# Altium footprint library CAP_TH.PcbLib: 220 footprints (part 7 of 14)
Each footprint in its own frame and in the unit in brackets; x right, y up, seen from the top. Pads: shape width x height; smd on the part's side, far side on the other; paste and mask are expansions set on the pad; w line width, h text height; cw(c..) or ccw(c..) is an arc to the next point about the centre after c.
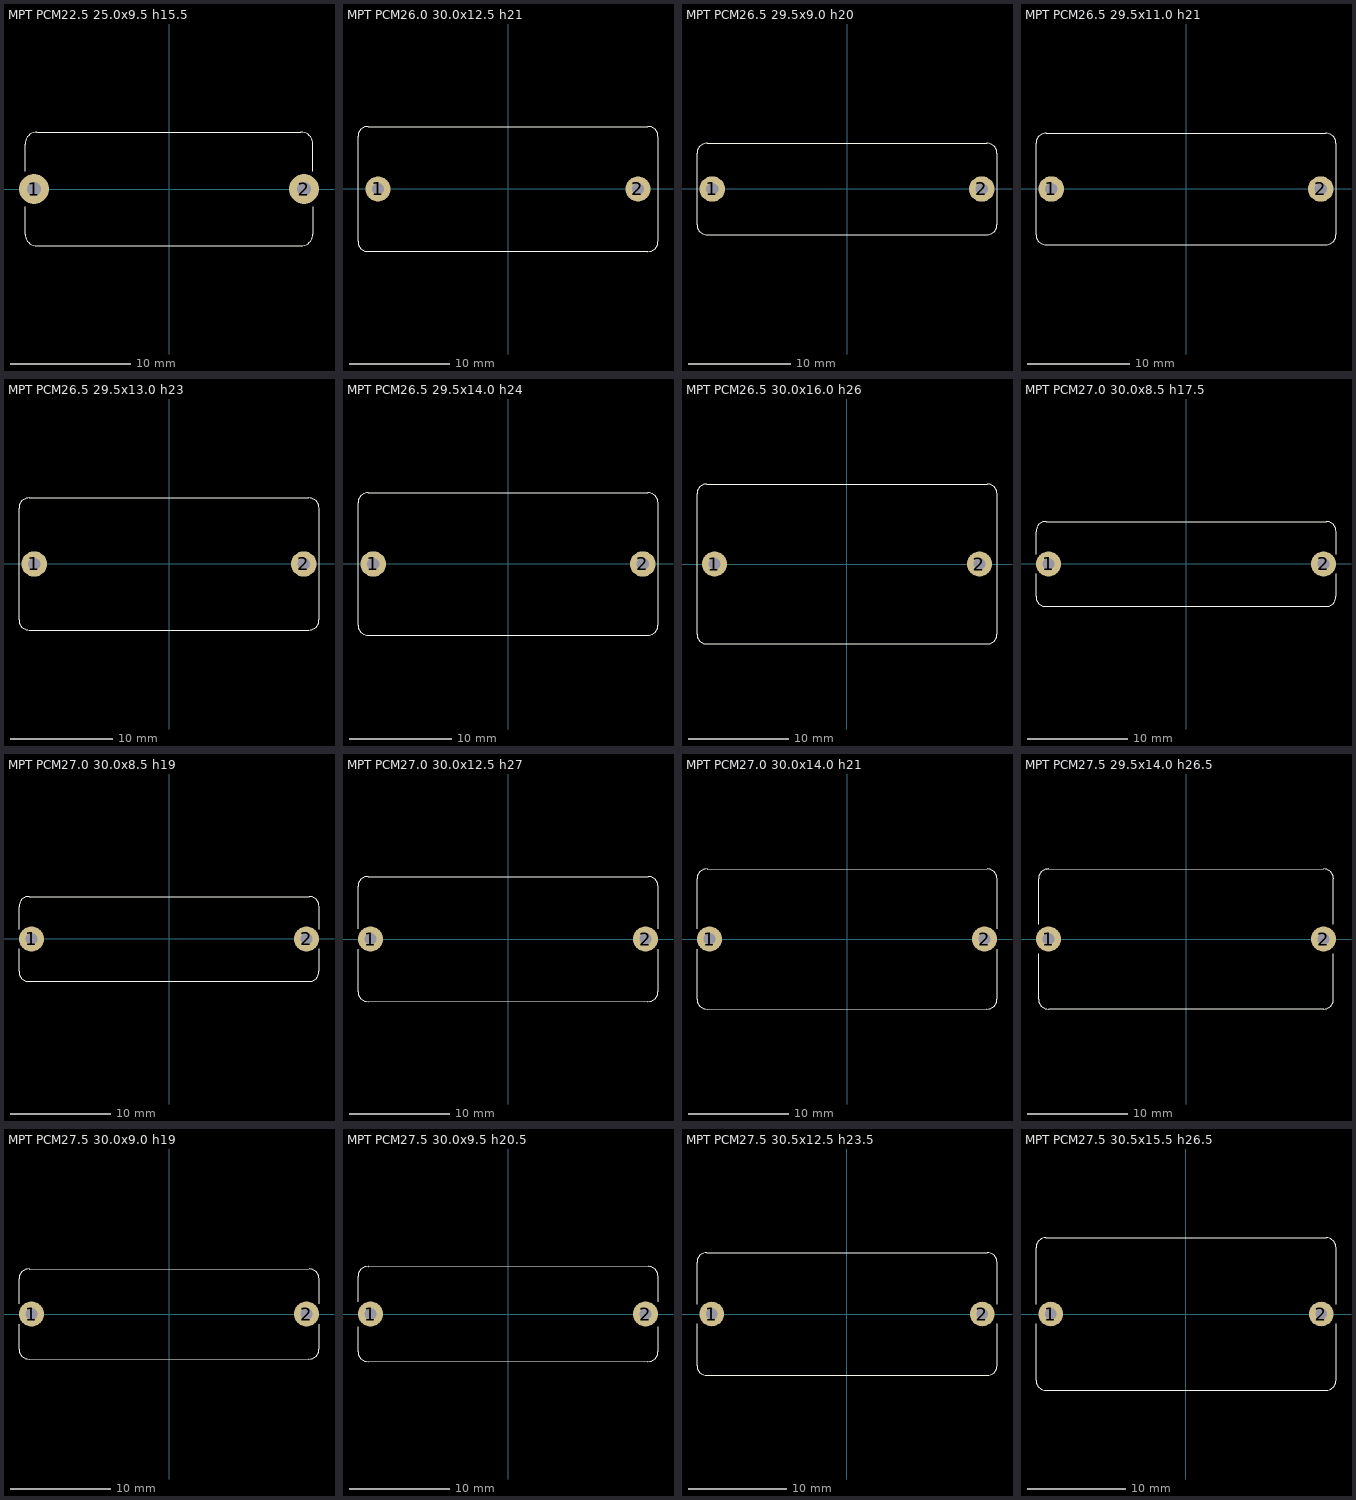
[diagram p6: the footprints below, top view; thin cyan lines are the x and y axes]

## MPT PCM22.5 25.0x9.5 h15.5 [mm]
pads (2):
  round 2.5 hole 1.2: 1(-11.25,0) 2(11.25,0)
Top Overlay:
  lines w0.1: -12,-1.5 -12,-3.75 ccw(c-11,-3.75) -11,-4.75 11,-4.75 ccw(c11,-3.75) 12,-3.75 12,-1.5 ; -12,1.5 -12,3.75 cw(c-11,3.75) -11,4.75 11,4.75 cw(c11,3.75) 12,3.75 12,1.5
3D body "MPT PCM22.5 25.0x9.5 h15.5.STEP": height 17.5, standoff -2, extent -12,-4.75 12,4.75

## MPT PCM26.0 30.0x12.5 h21 [mm]
pads (2):
  round 2.5 hole 1.2: 1(-13,0) 2(13,0)
Top Overlay:
  lines w0.1: -15,-5.25 ccw(c-14,-5.25) -14,-6.25 14,-6.25 ccw(c14,-5.25) 15,-5.25 15,5.25 ccw(c14,5.25) 14,6.25 -14,6.25 ccw(c-14,5.25) -15,5.25 -15,-5.25
3D body "MPT PCM26.0 30.0x12.5 h21.STEP": height 23, standoff -2, extent -15,-6.25 15,6.25

## MPT PCM26.5 29.5x9.0 h20 [mm]
pads (2):
  round 2.5 hole 1.2: 1(-13.25,0) 2(13.25,0)
Top Overlay:
  lines w0.1: -14.75,-3.5 ccw(c-13.75,-3.5) -13.75,-4.5 13.75,-4.5 ccw(c13.75,-3.5) 14.75,-3.5 14.75,3.5 ccw(c13.75,3.5) 13.75,4.5 -13.75,4.5 ccw(c-13.75,3.5) -14.75,3.5 -14.75,-3.5
3D body "MPT PCM26.5 29.5x9.0 h20.STEP": height 22, standoff -2, extent -14.75,-4.5 14.75,4.5

## MPT PCM26.5 29.5x11.0 h21 [mm]
pads (2):
  round 2.5 hole 1.2: 1(-13.25,0) 2(13.25,0)
Top Overlay:
  lines w0.1: -14.75,-4.5 ccw(c-13.75,-4.5) -13.75,-5.5 13.75,-5.5 ccw(c13.75,-4.5) 14.75,-4.5 14.75,4.5 ccw(c13.75,4.5) 13.75,5.5 -13.75,5.5 ccw(c-13.75,4.5) -14.75,4.5 -14.75,-4.5
3D body "MPT PCM26.5 29.5x11.0 h21.STEP": height 23, standoff -2, extent -14.75,-5.5 14.75,5.5

## MPT PCM26.5 29.5x13.0 h23 [mm]
pads (2):
  round 2.5 hole 1.2: 1(-13.25,0) 2(13.25,0)
Top Overlay:
  lines w0.1: -14.75,-5.5 ccw(c-13.75,-5.5) -13.75,-6.5 13.75,-6.5 ccw(c13.75,-5.5) 14.75,-5.5 14.75,5.5 ccw(c13.75,5.5) 13.75,6.5 -13.75,6.5 ccw(c-13.75,5.5) -14.75,5.5 -14.75,-5.5
3D body "MPT PCM26.5 29.5x13.0 h23.STEP": height 25, standoff -2, extent -14.75,-6.5 14.75,6.5

## MPT PCM26.5 29.5x14.0 h24 [mm]
pads (2):
  round 2.5 hole 1.2: 1(-13.25,0) 2(13.25,0)
Top Overlay:
  lines w0.1: -14.75,-6 ccw(c-13.75,-6) -13.75,-7 13.75,-7 ccw(c13.75,-6) 14.75,-6 14.75,6 ccw(c13.75,6) 13.75,7 -13.75,7 ccw(c-13.75,6) -14.75,6 -14.75,-6
3D body "MPT PCM26.5 29.5x14.0 h24.STEP": height 26.5, standoff -2, extent -14.75,-7 14.75,7

## MPT PCM26.5 30.0x16.0 h26 [mm]
pads (2):
  round 2.5 hole 1.2: 1(-13.25,0) 2(13.25,0)
Top Overlay:
  lines w0.1: -15,-7 ccw(c-14,-7) -14,-8 14,-8 ccw(c14,-7) 15,-7 15,7 ccw(c14,7) 14,8 -14,8 ccw(c-14,7) -15,7 -15,-7
3D body "MPT PCM26.5 30.0x16.0 h26.STEP": height 28, standoff -2, extent -15,-8 15,8

## MPT PCM27.0 30.0x8.5 h17.5 [mm]
pads (2):
  round 2.5 hole 1.2: 1(-13.75,0) 2(13.75,0)
Top Overlay:
  lines w0.1: -15.004,-3.25 ccw(c-14.004,-3.25) -14.004,-4.25 13.996,-4.25 ccw(c13.996,-3.25) 14.996,-3.25 ; -15,-3.25 -15,-1 ; -15,1 -15,3.25 cw(c-14,3.25) -14,4.25 14,4.25 cw(c14,3.25) 15,3.25 15,1 ; 15,-3.25 15,-1
3D body "MPT PCM27.0 30.0x8.5 h17.5.STEP": height 19.5, standoff -2, extent -15,-4.25 15,4.25

## MPT PCM27.0 30.0x8.5 h19 [mm]
pads (2):
  round 2.5 hole 1.2: 1(-13.75,0) 2(13.75,0)
Top Overlay:
  lines w0.1: -15.004,-3.25 ccw(c-14.004,-3.25) -14.004,-4.25 13.996,-4.25 ccw(c13.996,-3.25) 14.996,-3.25 ; -15,-3.25 -15,-1 ; -15,1 -15,3.25 cw(c-14,3.25) -14,4.25 14,4.25 cw(c14,3.25) 15,3.25 15,1 ; 15,-3.25 15,-1
3D body "MPT PCM27.0 30.0x8.5 h19.STEP": height 21, standoff -2, extent -15,-4.25 15,4.25

## MPT PCM27.0 30.0x12.5 h27 [mm]
pads (2):
  round 2.5 hole 1.2: 1(-13.75,0) 2(13.75,0)
Top Overlay:
  lines w0.1: -15,-1 -15,-5.25 ccw(c-14,-5.25) -14,-6.25 14,-6.25 ccw(c14,-5.25) 15,-5.25 15,-1 ; -15,1 -15,5.25 cw(c-14,5.25) -14,6.25 14,6.25 cw(c14,5.25) 15,5.25 15,1
3D body "MPT PCM27.0 30.0x12.5 h27.STEP": height 29, standoff -2, extent -15,-6.25 15,6.25

## MPT PCM27.0 30.0x14.0 h21 [mm]
pads (2):
  round 2.5 hole 1.2: 1(-13.75,0) 2(13.75,0)
Top Overlay:
  lines w0.1: -15,-1 -15,-6 ccw(c-14,-6) -14,-7 14,-7 ccw(c14,-6) 15,-6 15,-1 ; -15,1 -15,6 cw(c-14,6) -14,7 14,7 cw(c14,6) 15,6 15,1
3D body "MPT PCM27.0 30.0x14.0 h21.STEP": height 23, standoff -2, extent -15,-7 15,7

## MPT PCM27.5 29.5x14.0 h26.5 [mm]
pads (2):
  round 2.5 hole 1.2: 1(-13.75,0) 2(13.75,0)
Top Overlay:
  lines w0.1: -14.75,-1.5 -14.75,-6 ccw(c-13.75,-6) -13.75,-7 13.75,-7 ccw(c13.75,-6) 14.75,-6 14.75,-1.5 ; -14.75,1.5 -14.75,6 cw(c-13.75,6) -13.75,7 ; -14,7 13.75,7 cw(c13.75,6) 14.75,6 14.75,1.5
3D body "MPT PCM27.5 29.5x14.0 h26.5.STEP": height 28.5, standoff -2, extent -14.75,-7 14.75,7

## MPT PCM27.5 30.0x9.0 h19 [mm]
pads (2):
  round 2.5 hole 1.2: 1(-13.75,0) 2(13.75,0)
Top Overlay:
  lines w0.1: -15,-1 -15,-3.5 ccw(c-14,-3.5) -14,-4.5 14,-4.5 ccw(c14,-3.5) 15,-3.5 15,-1 ; -15,1 -15,3.5 cw(c-14,3.5) -14,4.5 14,4.5 cw(c14,3.5) 15,3.5 15,1
3D body "MPT PCM27.5 30.0x9.0 h19.STEP": height 21, standoff -2, extent -15,-4.5 15,4.5

## MPT PCM27.5 30.0x9.5 h20.5 [mm]
pads (2):
  round 2.5 hole 1.2: 1(-13.75,0) 2(13.75,0)
Top Overlay:
  lines w0.1: -15,-1.25 -15,-3.75 ccw(c-14,-3.75) -14,-4.75 14,-4.75 ccw(c14,-3.75) 15,-3.75 15,-1.25 ; -15,1.25 -15,3.75 cw(c-14,3.75) -14,4.75 14,4.75 cw(c14,3.75) 15,3.75 15,1.25
3D body "MPT PCM27.5 30.0x9.5 h20.5.STEP": height 22.5, standoff -2, extent -15,-4.75 15,4.75

## MPT PCM27.5 30.5x12.5 h23.5 [mm]
pads (2):
  round 2.5 hole 1.2: 1(-13.75,0) 2(13.75,0)
Top Overlay:
  lines w0.1: -15.25,-1 -15.25,-5.25 ccw(c-14.25,-5.25) -14.25,-6.25 14.25,-6.25 ccw(c14.25,-5.25) 15.25,-5.25 15.25,-1 ; -15.25,1 -15.25,5.25 cw(c-14.25,5.25) -14.25,6.25 14.25,6.25 cw(c14.25,5.25) 15.25,5.25 15.25,1
3D body "MPT PCM27.5 30.5x12.5 h23.5.STEP": height 29.5, standoff -2, extent -15.25,-6.25 15.25,6.25

## MPT PCM27.5 30.5x15.5 h26.5 [mm]
pads (2):
  round 2.5 hole 1.2: 1(-13.75,0) 2(13.75,0)
Top Overlay:
  lines w0.1: -15.25,-1 -15.25,-6.75 ccw(c-14.25,-6.75) -14.25,-7.75 14.25,-7.75 ccw(c14.25,-6.75) 15.25,-6.75 15.25,-1 ; -15.25,1 -15.25,6.75 cw(c-14.25,6.75) -14.25,7.75 14.25,7.75 cw(c14.25,6.75) 15.25,6.75 15.25,1
3D body "MPT PCM27.5 30.5x15.5 h26.5.STEP": height 28.5, standoff -2, extent -15.25,-7.75 15.25,7.75